# Altium integrated library Dip_Switches_rev15a.intlib: 131 symbols (part 1 of 2)
Pins are listed as number, name and electrical type; pins without a type are passive.

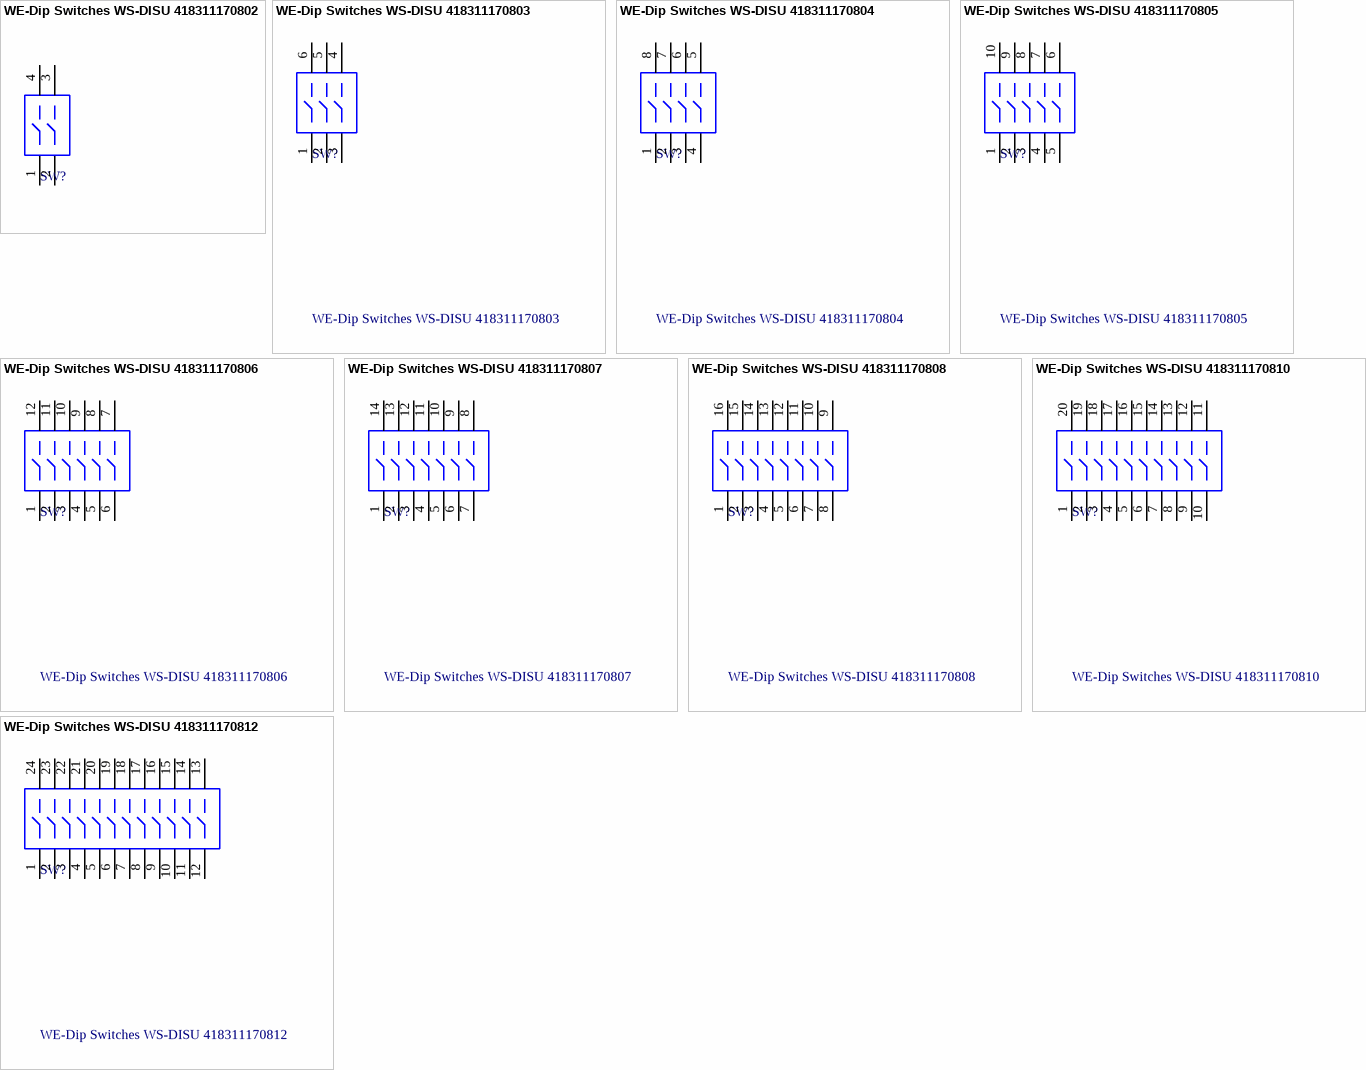
[diagram p0: symbols WE-Dip Switches WS-DISU 418311170802 to WE-Dip Switches WS-DISU 418311170812]

## WE-Dip Switches WS-DISU 418311170802
designator SW?
WS-DISU 2.54 mm piano type compact SMD Dip Switch with flat actuator; Manufacturer: Würth Elektronik eiSos GmbH & Co.KG; ComponentLink1 Description: Manufacturer; ComponentLink2 Description: Datasheet; Creat by: Karrer Zheng; NoPins: 4; Creat Date: 19 February 2014; partNo: 418311170802; ComponentLink1URL: http://www.we-online.com; ComponentLink2URL: http://katalog.we-online.de/em/datasheet/4183111708xx.pdf
footprint 418311170802 (02p, 2.54mm Pitch, Piano, Box Type SMT, flat Actuator, black, without Tape, T&R)
pins: 1, 2, 3, 4

## WE-Dip Switches WS-DISU 418311170803
designator SW?
WS-DISU 2.54 mm piano type compact SMD Dip Switch with flat actuator; Manufacturer: Würth Elektronik eiSos GmbH & Co.KG; ComponentLink1 Description: Manufacturer; ComponentLink2 Description: Datasheet; Creat by: Karrer Zheng; NoPins: 6; Creat Date: 19 February 2014; partNo: 418311170803; ComponentLink1URL: http://www.we-online.com; ComponentLink2URL: http://katalog.we-online.de/em/datasheet/4183111708xx.pdf
footprint 418311170803 (03p, 2.54mm Pitch, Piano, Box Type SMT, flat Actuator, black, without Tape, T&R)
pins: 1, 2, 3, 4, 5, 6

## WE-Dip Switches WS-DISU 418311170804
designator SW?
WS-DISU 2.54 mm piano type compact SMD Dip Switch with flat actuator; Manufacturer: Würth Elektronik eiSos GmbH & Co.KG; ComponentLink1 Description: Manufacturer; ComponentLink2 Description: Datasheet; Creat by: Karrer Zheng; NoPins: 8; Creat Date: 19 February 2014; partNo: 418311170804; ComponentLink1URL: http://www.we-online.com; ComponentLink2URL: http://katalog.we-online.de/em/datasheet/4183111708xx.pdf
footprint 418311170804 (04p, 2.54mm Pitch, Piano, Box Type SMT, flat Actuator, black, without Tape, T&R)
pins: 1, 2, 3, 4, 5, 6, 7, 8

## WE-Dip Switches WS-DISU 418311170805
designator SW?
WS-DISU 2.54 mm piano type compact SMD Dip Switch with flat actuator; Manufacturer: Würth Elektronik eiSos GmbH & Co.KG; ComponentLink1 Description: Manufacturer; ComponentLink2 Description: Datasheet; Creat by: Karrer Zheng; NoPins: 10; Creat Date: 19 February 2014; partNo: 418311170805; ComponentLink1URL: http://www.we-online.com; ComponentLink2URL: http://katalog.we-online.de/em/datasheet/4183111708xx.pdf
footprint 418311170805 (05p, 2.54mm Pitch, Piano, Box Type SMT, flat Actuator, black, without Tape, T&R)
pins: 1, 2, 3, 4, 5, 6, 7, 8, 9, 10

## WE-Dip Switches WS-DISU 418311170806
designator SW?
WS-DISU 2.54 mm piano type compact SMD Dip Switch with flat actuator; Manufacturer: Würth Elektronik eiSos GmbH & Co.KG; ComponentLink1 Description: Manufacturer; ComponentLink2 Description: Datasheet; Creat by: Karrer Zheng; NoPins: 12; Creat Date: 19 February 2014; partNo: 418311170806; ComponentLink1URL: http://www.we-online.com; ComponentLink2URL: http://katalog.we-online.de/em/datasheet/4183111708xx.pdf
footprint 418311170806 (06p, 2.54mm Pitch, Piano, Box Type SMT, flat Actuator, black, without Tape, T&R)
pins: 1, 2, 3, 4, 5, 6, 7, 8, 9, 10, 11, 12

## WE-Dip Switches WS-DISU 418311170807
designator SW?
WS-DISU 2.54 mm piano type compact SMD Dip Switch with flat actuator; Manufacturer: Würth Elektronik eiSos GmbH & Co.KG; ComponentLink1 Description: Manufacturer; ComponentLink2 Description: Datasheet; Creat by: Karrer Zheng; NoPins: 14; Creat Date: 19 February 2014; partNo: 418311170807; ComponentLink1URL: http://www.we-online.com; ComponentLink2URL: http://katalog.we-online.de/em/datasheet/4183111708xx.pdf
footprint 418311170807 (07p, 2.54mm Pitch, Piano, Box Type SMT, flat Actuator, black, without Tape, T&R)
pins: 1, 2, 3, 4, 5, 6, 7, 8, 9, 10, 11, 12, 13, 14

## WE-Dip Switches WS-DISU 418311170808
designator SW?
WS-DISU 2.54 mm piano type compact SMD Dip Switch with flat actuator; Manufacturer: Würth Elektronik eiSos GmbH & Co.KG; ComponentLink1 Description: Manufacturer; ComponentLink2 Description: Datasheet; Creat by: Karrer Zheng; NoPins: 16; Creat Date: 19 February 2014; partNo: 418311170808; ComponentLink1URL: http://www.we-online.com; ComponentLink2URL: http://katalog.we-online.de/em/datasheet/4183111708xx.pdf
footprint 418311170808 (08p, 2.54mm Pitch, Piano, Box Type SMT, flat Actuator, black, without Tape, T&R)
pins: 1, 2, 3, 4, 5, 6, 7, 8, 9, 10, 11, 12, 13, 14, 15, 16

## WE-Dip Switches WS-DISU 418311170810
designator SW?
WS-DISU 2.54 mm piano type compact SMD Dip Switch with flat actuator; Manufacturer: Würth Elektronik eiSos GmbH & Co.KG; ComponentLink1 Description: Manufacturer; ComponentLink2 Description: Datasheet; Creat by: Karrer Zheng; NoPins: 20; Creat Date: 19 February 2014; partNo: 418311170810; ComponentLink1URL: http://www.we-online.com; ComponentLink2URL: http://katalog.we-online.de/em/datasheet/4183111708xx.pdf
footprint 418311170810 (10p, 2.54mm Pitch, Piano, Box Type SMT, flat Actuator, black, without Tape, T&R)
pins: 1, 2, 3, 4, 5, 6, 7, 8, 9, 10, 11, 12, 13, 14, 15, 16, 17, 18, 19, 20

## WE-Dip Switches WS-DISU 418311170812
designator SW?
WS-DISU 2.54 mm piano type compact SMD Dip Switch with flat actuator; Manufacturer: Würth Elektronik eiSos GmbH & Co.KG; ComponentLink1 Description: Manufacturer; ComponentLink2 Description: Datasheet; Creat by: Karrer Zheng; NoPins: 24; Creat Date: 19 February 2014; partNo: 418311170812; ComponentLink1URL: http://www.we-online.com; ComponentLink2URL: http://katalog.we-online.de/em/datasheet/4183111708xx.pdf
footprint 418311170812 (12p, 2.54mm Pitch, Piano, Box Type SMT, flat Actuator, black, without Tape, T&R)
pins: 1, 2, 3, 4, 5, 6, 7, 8, 9, 10, 11, 12, 13, 14, 15, 16, 17, 18, 19, 20, 21, 22, 23, 24


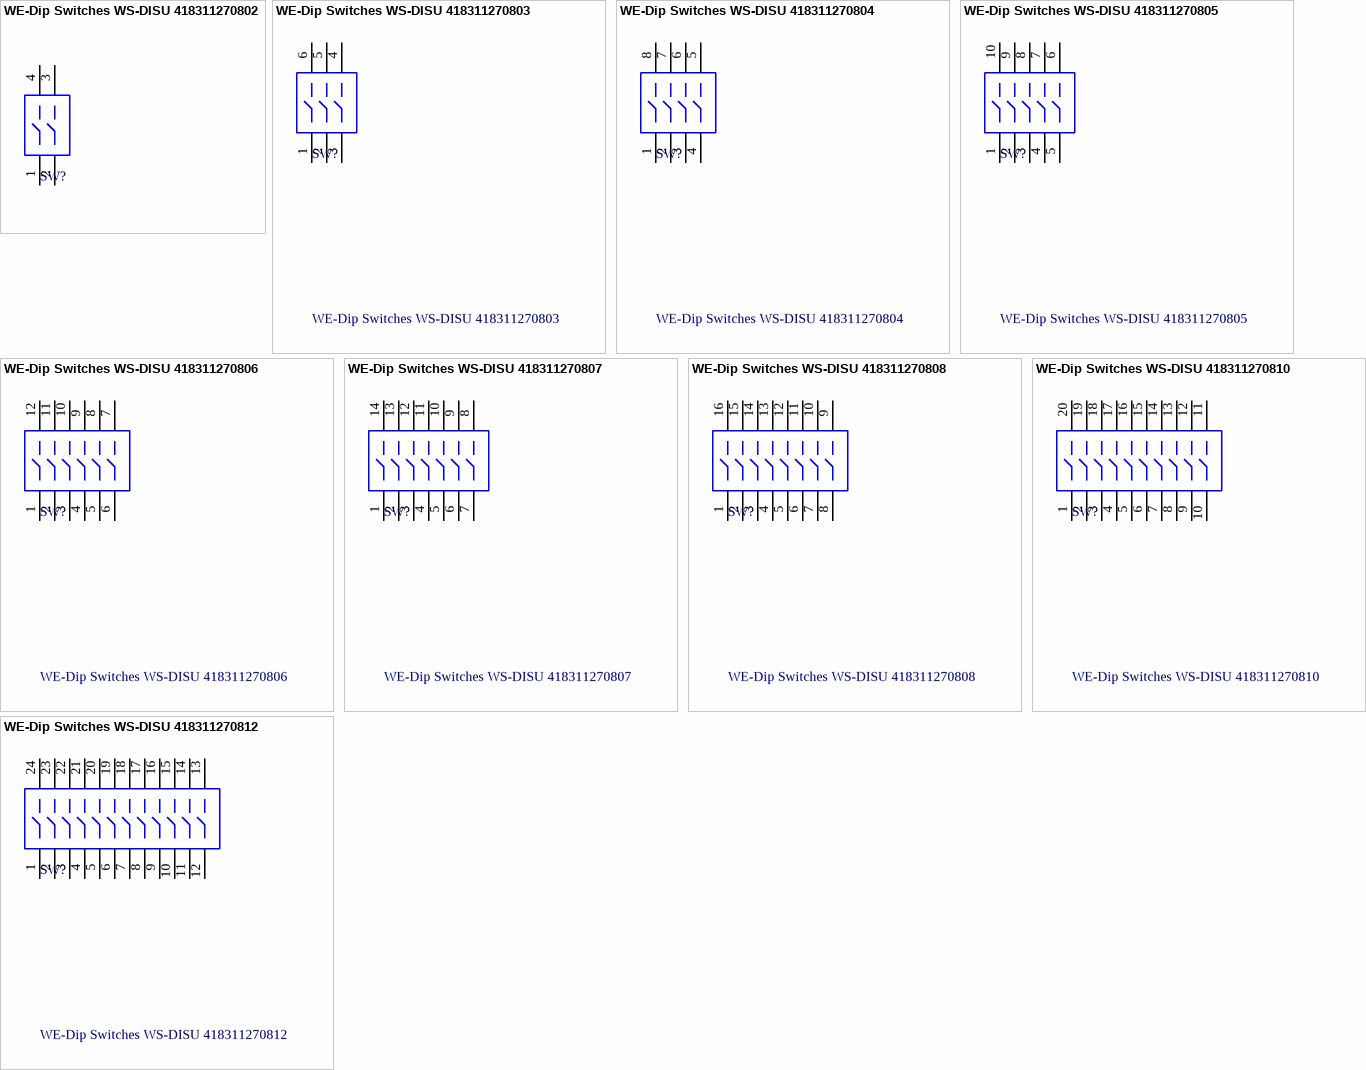
[diagram p1: symbols WE-Dip Switches WS-DISU 418311270802 to WE-Dip Switches WS-DISU 418311270812]

## WE-Dip Switches WS-DISU 418311270802
designator SW?
WS-DISU 2.54 mm piano type compact SMD Dip Switch with raised actuator; Manufacturer: Würth Elektronik eiSos GmbH & Co.KG; ComponentLink1 Description: Manufacturer; ComponentLink2 Description: Datasheet; Creat by: Karrer Zheng; NoPins: 04; Creat Date: 19 February 2014; partNo: 418311270802; ComponentLink1URL: http://www.we-online.com; ComponentLink2URL: http://katalog.we-online.de/em/datasheet/4183112708xx.pdf
footprint 418311270802 (02p, 2.54mm Pitch, Piano, Box Type SMT, raised Actuator, black, without Tape, T&R)
pins: 1, 2, 3, 4

## WE-Dip Switches WS-DISU 418311270803
designator SW?
WS-DISU 2.54 mm piano type compact SMD Dip Switch with raised actuator; Manufacturer: Würth Elektronik eiSos GmbH & Co.KG; ComponentLink1 Description: Manufacturer; ComponentLink2 Description: Datasheet; Creat by: Karrer Zheng; NoPins: 06; Creat Date: 19 February 2014; partNo: 418311270803; ComponentLink1URL: http://www.we-online.com; ComponentLink2URL: http://katalog.we-online.de/em/datasheet/4183112708xx.pdf
footprint 418311270803 (03p, 2.54mm Pitch, Piano, Box Type SMT, raised Actuator, black, without Tape, T&R)
pins: 1, 2, 3, 4, 5, 6

## WE-Dip Switches WS-DISU 418311270804
designator SW?
WS-DISU 2.54 mm piano type compact SMD Dip Switch with raised actuator; Manufacturer: Würth Elektronik eiSos GmbH & Co.KG; ComponentLink1 Description: Manufacturer; ComponentLink2 Description: Datasheet; Creat by: Karrer Zheng; NoPins: 8; Creat Date: 19 February 2014; partNo: 418311270804; ComponentLink1URL: http://www.we-online.com; ComponentLink2URL: http://katalog.we-online.de/em/datasheet/4183112708xx.pdf
footprint 418311270804 (04p, 2.54mm Pitch, Piano, Box Type SMT, raised Actuator, black, without Tape, T&R)
pins: 1, 2, 3, 4, 5, 6, 7, 8

## WE-Dip Switches WS-DISU 418311270805
designator SW?
WS-DISU 2.54 mm piano type compact SMD Dip Switch with raised actuator; Manufacturer: Würth Elektronik eiSos GmbH & Co.KG; ComponentLink1 Description: Manufacturer; ComponentLink2 Description: Datasheet; Creat by: Karrer Zheng; NoPins: 10; Creat Date: 19 February 2014; partNo: 418311270805; ComponentLink1URL: http://www.we-online.com; ComponentLink2URL: http://katalog.we-online.de/em/datasheet/4183112708xx.pdf
footprint 418311270805 (05p, 2.54mm Pitch, Piano, Box Type SMT, raised Actuator, black, without Tape, T&R)
pins: 1, 2, 3, 4, 5, 6, 7, 8, 9, 10

## WE-Dip Switches WS-DISU 418311270806
designator SW?
WS-DISU 2.54 mm piano type compact SMD Dip Switch with raised actuator; Manufacturer: Würth Elektronik eiSos GmbH & Co.KG; ComponentLink1 Description: Manufacturer; ComponentLink2 Description: Datasheet; Creat by: Karrer Zheng; NoPins: 12; Creat Date: 19 February 2014; partNo: 418311270806; ComponentLink1URL: http://www.we-online.com; ComponentLink2URL: http://katalog.we-online.de/em/datasheet/4183112708xx.pdf
footprint 418311270806 (06p, 2.54mm Pitch, Piano, Box Type SMT, raised Actuator, black, without Tape, T&R)
pins: 1, 2, 3, 4, 5, 6, 7, 8, 9, 10, 11, 12

## WE-Dip Switches WS-DISU 418311270807
designator SW?
WS-DISU 2.54 mm piano type compact SMD Dip Switch with raised actuator; Manufacturer: Würth Elektronik eiSos GmbH & Co.KG; ComponentLink1 Description: Manufacturer; ComponentLink2 Description: Datasheet; Creat by: Karrer Zheng; NoPins: 14; Creat Date: 19 February 2014; partNo: 418311270807; ComponentLink1URL: http://www.we-online.com; ComponentLink2URL: http://katalog.we-online.de/em/datasheet/4183112708xx.pdf
footprint 418311270807 (07p, 2.54mm Pitch, Piano, Box Type SMT, raised Actuator, black, without Tape, T&R)
pins: 1, 2, 3, 4, 5, 6, 7, 8, 9, 10, 11, 12, 13, 14

## WE-Dip Switches WS-DISU 418311270808
designator SW?
WS-DISU 2.54 mm piano type compact SMD Dip Switch with raised actuator; Manufacturer: Würth Elektronik eiSos GmbH & Co.KG; ComponentLink1 Description: Manufacturer; ComponentLink2 Description: Datasheet; Creat by: Karrer Zheng; NoPins: 16; Creat Date: 19 February 2014; partNo: 418311270808; ComponentLink1URL: http://www.we-online.com; ComponentLink2URL: http://katalog.we-online.de/em/datasheet/4183112708xx.pdf
footprint 418311270808 (08p, 2.54mm Pitch, Piano, Box Type SMT, raised Actuator, black, without Tape, T&R)
pins: 1, 2, 3, 4, 5, 6, 7, 8, 9, 10, 11, 12, 13, 14, 15, 16

## WE-Dip Switches WS-DISU 418311270810
designator SW?
WS-DISU 2.54 mm piano type compact SMD Dip Switch with raised actuator; Manufacturer: Würth Elektronik eiSos GmbH & Co.KG; ComponentLink1 Description: Manufacturer; ComponentLink2 Description: Datasheet; Creat by: Karrer Zheng; NoPins: 20; Creat Date: 19 February 2014; partNo: 418311270810; ComponentLink1URL: http://www.we-online.com; ComponentLink2URL: http://katalog.we-online.de/em/datasheet/4183112708xx.pdf
footprint 418311270810 (10p, 2.54mm Pitch, Piano, Box Type SMT, raised Actuator, black, without Tape, T&R)
pins: 1, 2, 3, 4, 5, 6, 7, 8, 9, 10, 11, 12, 13, 14, 15, 16, 17, 18, 19, 20

## WE-Dip Switches WS-DISU 418311270812
designator SW?
WS-DISU 2.54 mm piano type compact SMD Dip Switch with raised actuator; Manufacturer: Würth Elektronik eiSos GmbH & Co.KG; ComponentLink1 Description: Manufacturer; ComponentLink2 Description: Datasheet; Creat by: Karrer Zheng; NoPins: 24; Creat Date: 19 February 2014; partNo: 418311270812; ComponentLink1URL: http://www.we-online.com; ComponentLink2URL: http://katalog.we-online.de/em/datasheet/4183112708xx.pdf
footprint 418311270812 (12p, 2.54mm Pitch, Piano, Box Type SMT, raised Actuator, black, without Tape, T&R)
pins: 1, 2, 3, 4, 5, 6, 7, 8, 9, 10, 11, 12, 13, 14, 15, 16, 17, 18, 19, 20, 21, 22, 23, 24


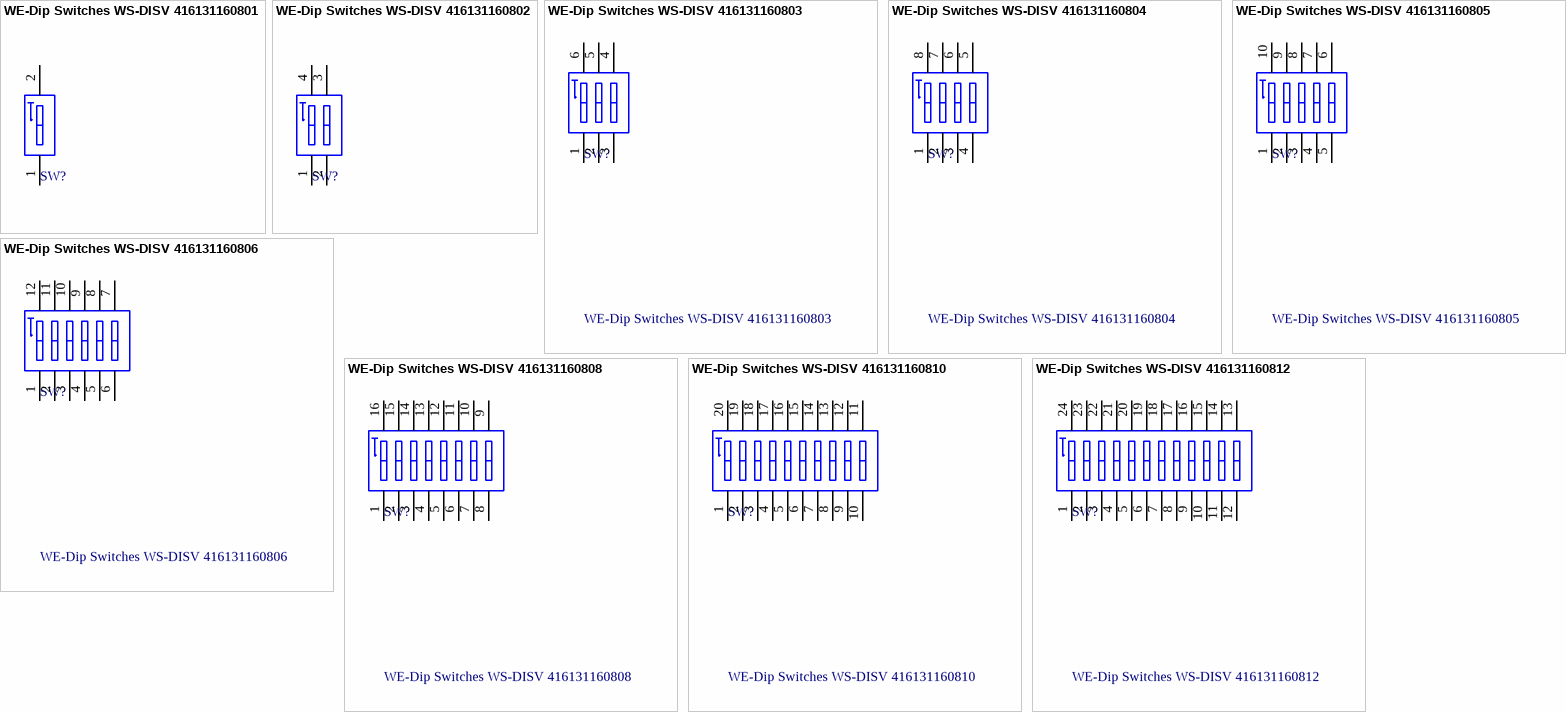
[diagram p2: symbols WE-Dip Switches WS-DISV 416131160801 to WE-Dip Switches WS-DISV 416131160812]

## WE-Dip Switches WS-DISV 416131160801
designator SW?
WS-DISV 1.27 mm small compact SMD Dip Switch with top tape; Manufacturer: Würth Elektronik eiSos GmbH & Co.KG; ComponentLink1 Description: Manufacturer; ComponentLink2 Description: Datasheet; Creat by: Karrer Zheng; NoPins: 02; Creat Date: 20 February 2014; partNo: 416131160801; ComponentLink1URL: http://www.we-online.com; ComponentLink2URL: http://katalog.we-online.de/em/datasheet/4161311608xx.pdf
footprint 416131160801 (01p, 1.27mm Pitch, Horizontal, HP Type, SMT, flat Actuator, black, with Tape, T&R)
pins: 1, 2

## WE-Dip Switches WS-DISV 416131160802
designator SW?
WS-DISV 1.27 mm small compact SMD Dip Switch with top tape; Manufacturer: Würth Elektronik eiSos GmbH & Co.KG; ComponentLink1 Description: Manufacturer; ComponentLink2 Description: Datasheet; Creat by: Karrer Zheng; NoPins: 04; Creat Date: 20 February 2014; partNo: 416131160802; ComponentLink1URL: http://www.we-online.com; ComponentLink2URL: http://katalog.we-online.de/em/datasheet/4161311608xx.pdf
footprint 416131160802 (02p, 1.27mm Pitch, Horizontal, HP Type, SMT, flat Actuator, black, with Tape, T&R)
pins: 1, 2, 3, 4

## WE-Dip Switches WS-DISV 416131160803
designator SW?
WS-DISV 1.27 mm small compact SMD Dip Switch with top tape; Manufacturer: Würth Elektronik eiSos GmbH & Co.KG; ComponentLink1 Description: Manufacturer; ComponentLink2 Description: Datasheet; Creat by: Karrer Zheng; NoPins: 06; Creat Date: 20 February 2014; partNo: 416131160803; ComponentLink1URL: http://www.we-online.com; ComponentLink2URL: http://katalog.we-online.de/em/datasheet/4161311608xx.pdf
footprint 416131160803 (03p, 1.27mm Pitch, Horizontal, HP Type, SMT, flat Actuator, black, with Tape, T&R)
pins: 1, 2, 3, 4, 5, 6

## WE-Dip Switches WS-DISV 416131160804
designator SW?
WS-DISV 1.27 mm small compact SMD Dip Switch with top tape; Manufacturer: Würth Elektronik eiSos GmbH & Co.KG; ComponentLink1 Description: Manufacturer; ComponentLink2 Description: Datasheet; Creat by: Karrer Zheng; NoPins: 08; Creat Date: 20 February 2014; partNo: 416131160804; ComponentLink1URL: http://www.we-online.com; ComponentLink2URL: http://katalog.we-online.de/em/datasheet/4161311608xx.pdf
footprint 416131160804 (04p, 1.27mm Pitch, Horizontal, HP Type, SMT, flat Actuator, black, with Tape, T&R)
pins: 1, 2, 3, 4, 5, 6, 7, 8

## WE-Dip Switches WS-DISV 416131160805
designator SW?
WS-DISV 1.27 mm small compact SMD Dip Switch with top tape; Manufacturer: Würth Elektronik eiSos GmbH & Co.KG; ComponentLink1 Description: Manufacturer; ComponentLink2 Description: Datasheet; Creat by: Karrer Zheng; NoPins: 10; Creat Date: 20 February 2014; partNo: 416131160805; ComponentLink1URL: http://www.we-online.com; ComponentLink2URL: http://katalog.we-online.de/em/datasheet/4161311608xx.pdf
footprint 416131160805 (05p, 1.27mm Pitch, Horizontal, HP Type, SMT, flat Actuator, black, with Tape, T&R)
pins: 1, 2, 3, 4, 5, 6, 7, 8, 9, 10

## WE-Dip Switches WS-DISV 416131160806
designator SW?
WS-DISV 1.27 mm small compact SMD Dip Switch with top tape; Manufacturer: Würth Elektronik eiSos GmbH & Co.KG; ComponentLink1 Description: Manufacturer; ComponentLink2 Description: Datasheet; Creat by: Karrer Zheng; NoPins: 12; Creat Date: 20 February 2014; partNo: 416131160806; ComponentLink1URL: http://www.we-online.com; ComponentLink2URL: http://katalog.we-online.de/em/datasheet/4161311608xx.pdf
footprint 416131160806 (06p, 1.27mm Pitch, Horizontal, HP Type, SMT, flat Actuator, black, with Tape, T&R)
pins: 1, 2, 3, 4, 5, 6, 7, 8, 9, 10, 11, 12

## WE-Dip Switches WS-DISV 416131160808
designator SW?
WS-DISV 1.27 mm small compact SMD Dip Switch with top tape; Manufacturer: Würth Elektronik eiSos GmbH & Co.KG; ComponentLink1 Description: Manufacturer; ComponentLink2 Description: Datasheet; Creat by: Karrer Zheng; NoPins: 16; Creat Date: 20 February 2014; partNo: 416131160808; ComponentLink1URL: http://www.we-online.com; ComponentLink2URL: http://katalog.we-online.de/em/datasheet/4161311608xx.pdf
footprint 416131160808 (08p, 1.27mm Pitch, Horizontal, HP Type, SMT, flat Actuator, black, with Tape, T&R)
pins: 1, 2, 3, 4, 5, 6, 7, 8, 9, 10, 11, 12, 13, 14, 15, 16

## WE-Dip Switches WS-DISV 416131160810
designator SW?
WS-DISV 1.27 mm small compact SMD Dip Switch with top tape; Manufacturer: Würth Elektronik eiSos GmbH & Co.KG; ComponentLink1 Description: Manufacturer; ComponentLink2 Description: Datasheet; Creat by: Karrer Zheng; NoPins: 20; Creat Date: 20 February 2014; partNo: 416131160810; ComponentLink1URL: http://www.we-online.com; ComponentLink2URL: http://katalog.we-online.de/em/datasheet/4161311608xx.pdf
footprint 416131160810 (10p, 1.27mm Pitch, Horizontal, HP Type, SMT, flat Actuator, black, with Tape, T&R)
pins: 1, 2, 3, 4, 5, 6, 7, 8, 9, 10, 11, 12, 13, 14, 15, 16, 17, 18, 19, 20

## WE-Dip Switches WS-DISV 416131160812
designator SW?
WS-DISV 1.27 mm small compact SMD Dip Switch with top tape; Manufacturer: Würth Elektronik eiSos GmbH & Co.KG; ComponentLink1 Description: Manufacturer; ComponentLink2 Description: Datasheet; Creat by: Karrer Zheng; NoPins: 24; Creat Date: 20 February 2014; partNo: 416131160812; ComponentLink1URL: http://www.we-online.com; ComponentLink2URL: http://katalog.we-online.de/em/datasheet/4161311608xx.pdf
footprint 416131160812 (12p, 1.27mm Pitch, Horizontal, HP Type, SMT, flat Actuator, black, with Tape, T&R)
pins: 1, 2, 3, 4, 5, 6, 7, 8, 9, 10, 11, 12, 13, 14, 15, 16, 17, 18, 19, 20, 21, 22, 23, 24


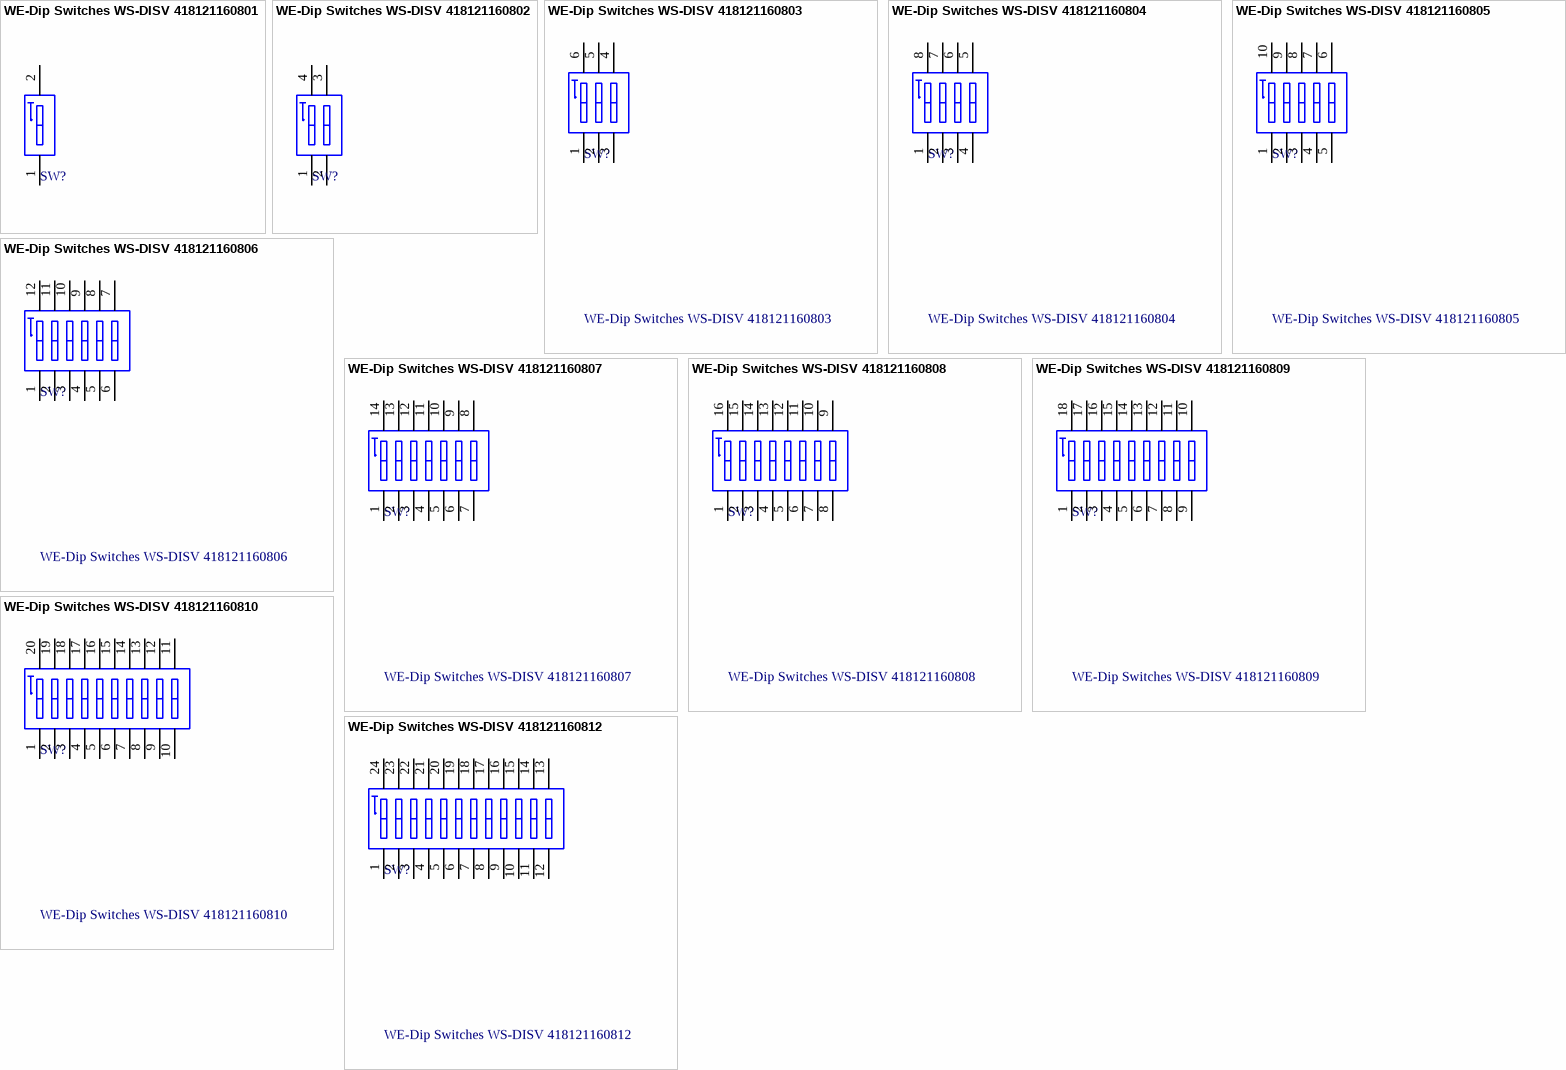
[diagram p3: symbols WE-Dip Switches WS-DISV 418121160801 to WE-Dip Switches WS-DISV 418121160812]

## WE-Dip Switches WS-DISV 418121160801
designator SW?
WS-DISV 2.54 mm small compact SMD Dip Switch with top tape; Manufacturer: Würth Elektronik eiSos GmbH & Co.KG; ComponentLink1 Description: Manufacturer; ComponentLink2 Description: Datasheet; Creat by: Karrer Zheng; NoPins: 02; Creat Date: 20 February 2014; partNo: 418121160801; ComponentLink1URL: http://www.we-online.com; ComponentLink2URL: http://katalog.we-online.de/em/datasheet/4181211608xx.pdf
footprint 418121160801 (01p, 2.54mm Pitch, Horizontal, IC Type, SMT, flat Actuator, black, with Tape, T&R)
pins: 1, 2

## WE-Dip Switches WS-DISV 418121160802
designator SW?
WS-DISV 2.54 mm small compact SMD Dip Switch with top tape; Manufacturer: Würth Elektronik eiSos GmbH & Co.KG; ComponentLink1 Description: Manufacturer; ComponentLink2 Description: Datasheet; Creat by: Karrer Zheng; NoPins: 04; Creat Date: 20 February 2014; partNo: 418121160802; ComponentLink1URL: http://www.we-online.com; ComponentLink2URL: http://katalog.we-online.de/em/datasheet/4181211608xx.pdf
footprint 418121160802 (02p, 2.54mm Pitch, Horizontal, IC Type, SMT, flat Actuator, black, with Tape, T&R)
pins: 1, 2, 3, 4

## WE-Dip Switches WS-DISV 418121160803
designator SW?
WS-DISV 2.54 mm small compact SMD Dip Switch with top tape; Manufacturer: Würth Elektronik eiSos GmbH & Co.KG; ComponentLink1 Description: Manufacturer; ComponentLink2 Description: Datasheet; Creat by: Karrer Zheng; NoPins: 06; Creat Date: 20 February 2014; partNo: 418121160803; ComponentLink1URL: http://www.we-online.com; ComponentLink2URL: http://katalog.we-online.de/em/datasheet/4181211608xx.pdf
footprint 418121160803 (03p, 2.54mm Pitch, Horizontal, IC Type, SMT, flat Actuator, black, with Tape, T&R)
pins: 1, 2, 3, 4, 5, 6

## WE-Dip Switches WS-DISV 418121160804
designator SW?
WS-DISV 2.54 mm small compact SMD Dip Switch with top tape; Manufacturer: Würth Elektronik eiSos GmbH & Co.KG; ComponentLink1 Description: Manufacturer; ComponentLink2 Description: Datasheet; Creat by: Karrer Zheng; NoPins: 08; Creat Date: 20 February 2014; partNo: 418121160804; ComponentLink1URL: http://www.we-online.com; ComponentLink2URL: http://katalog.we-online.de/em/datasheet/4181211608xx.pdf
footprint 418121160804 (04p, 2.54mm Pitch, Horizontal, IC Type, SMT, flat Actuator, black, with Tape, T&R)
pins: 1, 2, 3, 4, 5, 6, 7, 8

## WE-Dip Switches WS-DISV 418121160805
designator SW?
WS-DISV 2.54 mm small compact SMD Dip Switch with top tape; Manufacturer: Würth Elektronik eiSos GmbH & Co.KG; ComponentLink1 Description: Manufacturer; ComponentLink2 Description: Datasheet; Creat by: Karrer Zheng; NoPins: 10; Creat Date: 20 February 2014; partNo: 418121160805; ComponentLink1URL: http://www.we-online.com; ComponentLink2URL: http://katalog.we-online.de/em/datasheet/4181211608xx.pdf
footprint 418121160805 (05p, 2.54mm Pitch, Horizontal, IC Type, SMT, flat Actuator, black, with Tape, T&R)
pins: 1, 2, 3, 4, 5, 6, 7, 8, 9, 10

## WE-Dip Switches WS-DISV 418121160806
designator SW?
WS-DISV 2.54 mm small compact SMD Dip Switch with top tape; Manufacturer: Würth Elektronik eiSos GmbH & Co.KG; ComponentLink1 Description: Manufacturer; ComponentLink2 Description: Datasheet; Creat by: Karrer Zheng; NoPins: 12; Creat Date: 20 February 2014; partNo: 418121160806; ComponentLink1URL: http://www.we-online.com; ComponentLink2URL: http://katalog.we-online.de/em/datasheet/4181211608xx.pdf
footprint 418121160806 (06p, 2.54mm Pitch, Horizontal, IC Type, SMT, flat Actuator, black, with Tape, T&R)
pins: 1, 2, 3, 4, 5, 6, 7, 8, 9, 10, 11, 12

## WE-Dip Switches WS-DISV 418121160807
designator SW?
WS-DISV 2.54 mm small compact SMD Dip Switch with top tape; Manufacturer: Würth Elektronik eiSos GmbH & Co.KG; ComponentLink1 Description: Manufacturer; ComponentLink2 Description: Datasheet; Creat by: Karrer Zheng; NoPins: 14; Creat Date: 20 February 2014; partNo: 418121160807; ComponentLink1URL: http://www.we-online.com; ComponentLink2URL: http://katalog.we-online.de/em/datasheet/4181211608xx.pdf
footprint 418121160807 (07p, 2.54mm Pitch, Horizontal, IC Type, SMT, flat Actuator, black, with Tape, T&R)
pins: 1, 2, 3, 4, 5, 6, 7, 8, 9, 10, 11, 12, 13, 14

## WE-Dip Switches WS-DISV 418121160808
designator SW?
WS-DISV 2.54 mm small compact SMD Dip Switch with top tape; Manufacturer: Würth Elektronik eiSos GmbH & Co.KG; ComponentLink1 Description: Manufacturer; ComponentLink2 Description: Datasheet; Creat by: Karrer Zheng; NoPins: 16; Creat Date: 20 February 2014; partNo: 418121160808; ComponentLink1URL: http://www.we-online.com; ComponentLink2URL: http://katalog.we-online.de/em/datasheet/4181211608xx.pdf
footprint 418121160808 (08p, 2.54mm Pitch, Horizontal, IC Type, SMT, flat Actuator, black, with Tape, T&R)
pins: 1, 2, 3, 4, 5, 6, 7, 8, 9, 10, 11, 12, 13, 14, 15, 16

## WE-Dip Switches WS-DISV 418121160809
designator SW?
WS-DISV 2.54 mm small compact SMD Dip Switch with top tape; Manufacturer: Würth Elektronik eiSos GmbH & Co.KG; ComponentLink1 Description: Manufacturer; ComponentLink2 Description: Datasheet; Creat by: Karrer Zheng; NoPins: 18; Creat Date: 20 February 2014; partNo: 418121160809; ComponentLink1URL: http://www.we-online.com; ComponentLink2URL: http://katalog.we-online.de/em/datasheet/4181211608xx.pdf
footprint 418121160809 (09p, 2.54mm Pitch, Horizontal, IC Type, SMT, flat Actuator, black, with Tape, T&R)
pins: 1, 2, 3, 4, 5, 6, 7, 8, 9, 10, 11, 12, 13, 14, 15, 16, 17, 18

## WE-Dip Switches WS-DISV 418121160810
designator SW?
WS-DISV 2.54 mm small compact SMD Dip Switch with top tape; Manufacturer: Würth Elektronik eiSos GmbH & Co.KG; ComponentLink1 Description: Manufacturer; ComponentLink2 Description: Datasheet; Creat by: Karrer Zheng; NoPins: 12; Creat Date: 20 February 2014; partNo: 418121160810; ComponentLink1URL: http://www.we-online.com; ComponentLink2URL: http://katalog.we-online.de/em/datasheet/4181211608xx.pdf
footprint 418121160810 (10p, 2.54mm Pitch, Horizontal, IC Type, SMT, flat Actuator, black, with Tape, T&R)
pins: 1, 2, 3, 4, 5, 6, 7, 8, 9, 10, 11, 12, 13, 14, 15, 16, 17, 18, 19, 20

## WE-Dip Switches WS-DISV 418121160812
designator SW?
WS-DISV 2.54 mm small compact SMD Dip Switch with top tape; Manufacturer: Würth Elektronik eiSos GmbH & Co.KG; ComponentLink1 Description: Manufacturer; ComponentLink2 Description: Datasheet; Creat by: Karrer Zheng; NoPins: 24; Creat Date: 20 February 2014; partNo: 418121160812; ComponentLink1URL: http://www.we-online.com; ComponentLink2URL: http://katalog.we-online.de/em/datasheet/4181211608xx.pdf
footprint 418121160812 (12p, 2.54mm Pitch, Horizontal, IC Type, SMT, flat Actuator, black, with Tape, T&R)
pins: 1, 2, 3, 4, 5, 6, 7, 8, 9, 10, 11, 12, 13, 14, 15, 16, 17, 18, 19, 20, 21, 22, 23, 24


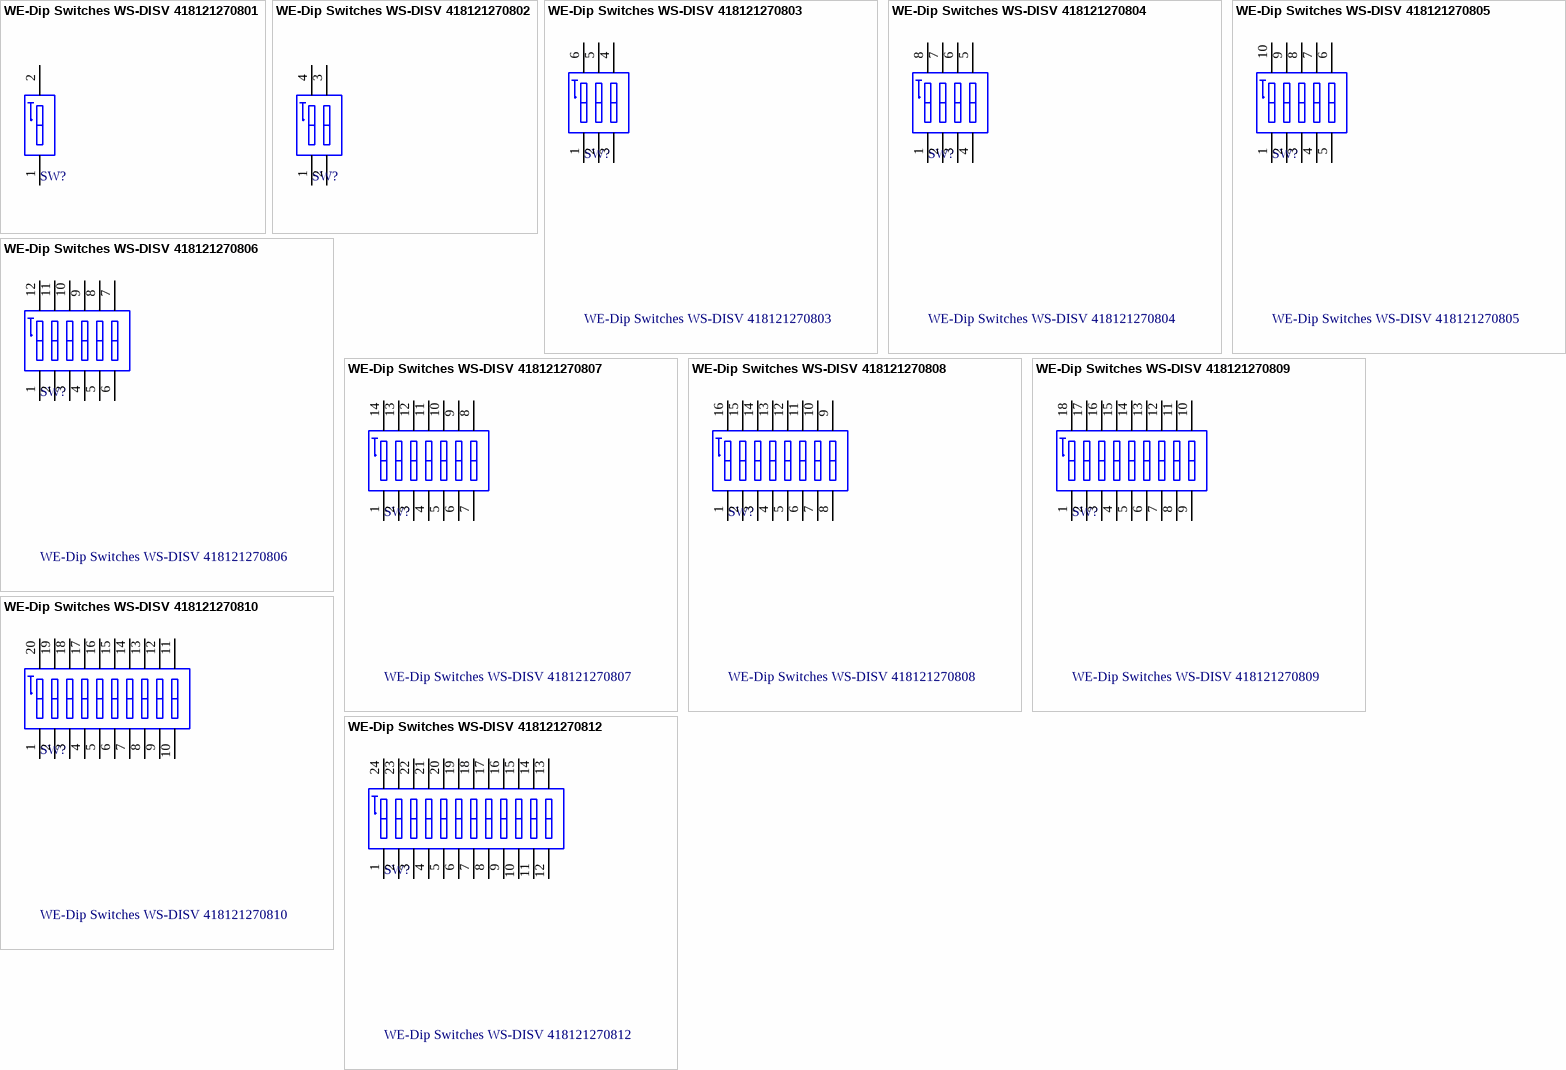
[diagram p4: symbols WE-Dip Switches WS-DISV 418121270801 to WE-Dip Switches WS-DISV 418121270812]

## WE-Dip Switches WS-DISV 418121270801
designator SW?
WS-DISV 2.54 mm small compact SMD Dip Switch with raised actuator; Manufacturer: Würth Elektronik eiSos GmbH & Co.KG; ComponentLink1 Description: Manufacturer; ComponentLink2 Description: Datasheet; Creat by: Karrer Zheng; NoPins: 02; Creat Date: 20 February 2014; partNo: 418121270801; ComponentLink1URL: http://www.we-online.com; ComponentLink2URL: http://katalog.we-online.de/em/datasheet/4181212708xx.pdf
footprint 418121270801 (01p, 2.54mm Pitch, Horizontal, IC Type, SMT, raised Actuator, black, without Tape, T&R)
pins: 1, 2

## WE-Dip Switches WS-DISV 418121270802
designator SW?
WS-DISV 2.54 mm small compact SMD Dip Switch with raised actuator; Manufacturer: Würth Elektronik eiSos GmbH & Co.KG; ComponentLink1 Description: Manufacturer; ComponentLink2 Description: Datasheet; Creat by: Karrer Zheng; NoPins: 04; Creat Date: 20 February 2014; partNo: 418121270802; ComponentLink1URL: http://www.we-online.com; ComponentLink2URL: http://katalog.we-online.de/em/datasheet/4181212708xx.pdf
footprint 418121270802 (02p, 2.54mm Pitch, Horizontal, IC Type, SMT, raised Actuator, black, without Tape, T&R)
pins: 1, 2, 3, 4

## WE-Dip Switches WS-DISV 418121270803
designator SW?
WS-DISV 2.54 mm small compact SMD Dip Switch with raised actuator; Manufacturer: Würth Elektronik eiSos GmbH & Co.KG; ComponentLink1 Description: Manufacturer; ComponentLink2 Description: Datasheet; Creat by: Karrer Zheng; NoPins: 06; Creat Date: 20 February 2014; partNo: 418121270803; ComponentLink1URL: http://www.we-online.com; ComponentLink2URL: http://katalog.we-online.de/em/datasheet/4181212708xx.pdf
footprint 418121270803 (03p, 2.54mm Pitch, Horizontal, IC Type, SMT, raised Actuator, black, without Tape, T&R)
pins: 1, 2, 3, 4, 5, 6

## WE-Dip Switches WS-DISV 418121270804
designator SW?
WS-DISV 2.54 mm small compact SMD Dip Switch with raised actuator; Manufacturer: Würth Elektronik eiSos GmbH & Co.KG; ComponentLink1 Description: Manufacturer; ComponentLink2 Description: Datasheet; Creat by: Karrer Zheng; NoPins: 08; Creat Date: 20 February 2014; partNo: 418121270804; ComponentLink1URL: http://www.we-online.com; ComponentLink2URL: http://katalog.we-online.de/em/datasheet/4181212708xx.pdf
footprint 418121270804 (04p, 2.54mm Pitch, Horizontal, IC Type, SMT, raised Actuator, black, without Tape, T&R)
pins: 1, 2, 3, 4, 5, 6, 7, 8

## WE-Dip Switches WS-DISV 418121270805
designator SW?
WS-DISV 2.54 mm small compact SMD Dip Switch with raised actuator; Manufacturer: Würth Elektronik eiSos GmbH & Co.KG; ComponentLink1 Description: Manufacturer; ComponentLink2 Description: Datasheet; Creat by: Karrer Zheng; NoPins: 10; Creat Date: 20 February 2014; partNo: 418121270805; ComponentLink1URL: http://www.we-online.com; ComponentLink2URL: http://katalog.we-online.de/em/datasheet/4181212708xx.pdf
footprint 418121270805 (05p, 2.54mm Pitch, Horizontal, IC Type, SMT, raised Actuator, black, without Tape, T&R)
pins: 1, 2, 3, 4, 5, 6, 7, 8, 9, 10

## WE-Dip Switches WS-DISV 418121270806
designator SW?
WS-DISV 2.54 mm small compact SMD Dip Switch with raised actuator; Manufacturer: Würth Elektronik eiSos GmbH & Co.KG; ComponentLink1 Description: Manufacturer; ComponentLink2 Description: Datasheet; Creat by: Karrer Zheng; NoPins: 12; Creat Date: 20 February 2014; partNo: 418121270806; ComponentLink1URL: http://www.we-online.com; ComponentLink2URL: http://katalog.we-online.de/em/datasheet/4181212708xx.pdf
footprint 418121270806 (06p, 2.54mm Pitch, Horizontal, IC Type, SMT, raised Actuator, black, without Tape, T&R)
pins: 1, 2, 3, 4, 5, 6, 7, 8, 9, 10, 11, 12

## WE-Dip Switches WS-DISV 418121270807
designator SW?
WS-DISV 2.54 mm small compact SMD Dip Switch with raised actuator; Manufacturer: Würth Elektronik eiSos GmbH & Co.KG; ComponentLink1 Description: Manufacturer; ComponentLink2 Description: Datasheet; Creat by: Karrer Zheng; NoPins: 14; Creat Date: 20 February 2014; partNo: 418121270807; ComponentLink1URL: http://www.we-online.com; ComponentLink2URL: http://katalog.we-online.de/em/datasheet/4181212708xx.pdf
footprint 418121270807 (07p, 2.54mm Pitch, Horizontal, IC Type, SMT, raised Actuator, black, without Tape, T&R)
pins: 1, 2, 3, 4, 5, 6, 7, 8, 9, 10, 11, 12, 13, 14

## WE-Dip Switches WS-DISV 418121270808
designator SW?
WS-DISV 2.54 mm small compact SMD Dip Switch with raised actuator; Manufacturer: Würth Elektronik eiSos GmbH & Co.KG; ComponentLink1 Description: Manufacturer; ComponentLink2 Description: Datasheet; Creat by: Karrer Zheng; NoPins: 16; Creat Date: 20 February 2014; partNo: 418121270808; ComponentLink1URL: http://www.we-online.com; ComponentLink2URL: http://katalog.we-online.de/em/datasheet/4181212708xx.pdf
footprint 418121270808 (08p, 2.54mm Pitch, Horizontal, IC Type, SMT, raised Actuator, black, without Tape, T&R)
pins: 1, 2, 3, 4, 5, 6, 7, 8, 9, 10, 11, 12, 13, 14, 15, 16

## WE-Dip Switches WS-DISV 418121270809
designator SW?
WS-DISV 2.54 mm small compact SMD Dip Switch with raised actuator; Manufacturer: Würth Elektronik eiSos GmbH & Co.KG; ComponentLink1 Description: Manufacturer; ComponentLink2 Description: Datasheet; Creat by: Karrer Zheng; NoPins: 18; Creat Date: 20 February 2014; partNo: 418121270809; ComponentLink1URL: http://www.we-online.com; ComponentLink2URL: http://katalog.we-online.de/em/datasheet/4181212708xx.pdf
footprint 418121270809 (09p, 2.54mm Pitch, Horizontal, IC Type, SMT, raised Actuator, black, without Tape, T&R)
pins: 1, 2, 3, 4, 5, 6, 7, 8, 9, 10, 11, 12, 13, 14, 15, 16, 17, 18

## WE-Dip Switches WS-DISV 418121270810
designator SW?
WS-DISV 2.54 mm small compact SMD Dip Switch with raised actuator; Manufacturer: Würth Elektronik eiSos GmbH & Co.KG; ComponentLink1 Description: Manufacturer; ComponentLink2 Description: Datasheet; Creat by: Karrer Zheng; NoPins: 20; Creat Date: 20 February 2014; partNo: 418121270810; ComponentLink1URL: http://www.we-online.com; ComponentLink2URL: http://katalog.we-online.de/em/datasheet/4181212708xx.pdf
footprint 418121270810 (10p, 2.54mm Pitch, Horizontal, IC Type, SMT, raised Actuator, black, without Tape, T&R)
pins: 1, 2, 3, 4, 5, 6, 7, 8, 9, 10, 11, 12, 13, 14, 15, 16, 17, 18, 19, 20

## WE-Dip Switches WS-DISV 418121270812
designator SW?
WS-DISV 2.54 mm small compact SMD Dip Switch with raised actuator; Manufacturer: Würth Elektronik eiSos GmbH & Co.KG; ComponentLink1 Description: Manufacturer; ComponentLink2 Description: Datasheet; Creat by: Karrer Zheng; NoPins: 24; Creat Date: 20 February 2014; partNo: 418121270812; ComponentLink1URL: http://www.we-online.com; ComponentLink2URL: http://katalog.we-online.de/em/datasheet/4181212708xx.pdf
footprint 418121270812 (12p, 2.54mm Pitch, Horizontal, IC Type, SMT, raised Actuator, black, without Tape, T&R)
pins: 1, 2, 3, 4, 5, 6, 7, 8, 9, 10, 11, 12, 13, 14, 15, 16, 17, 18, 19, 20, 21, 22, 23, 24


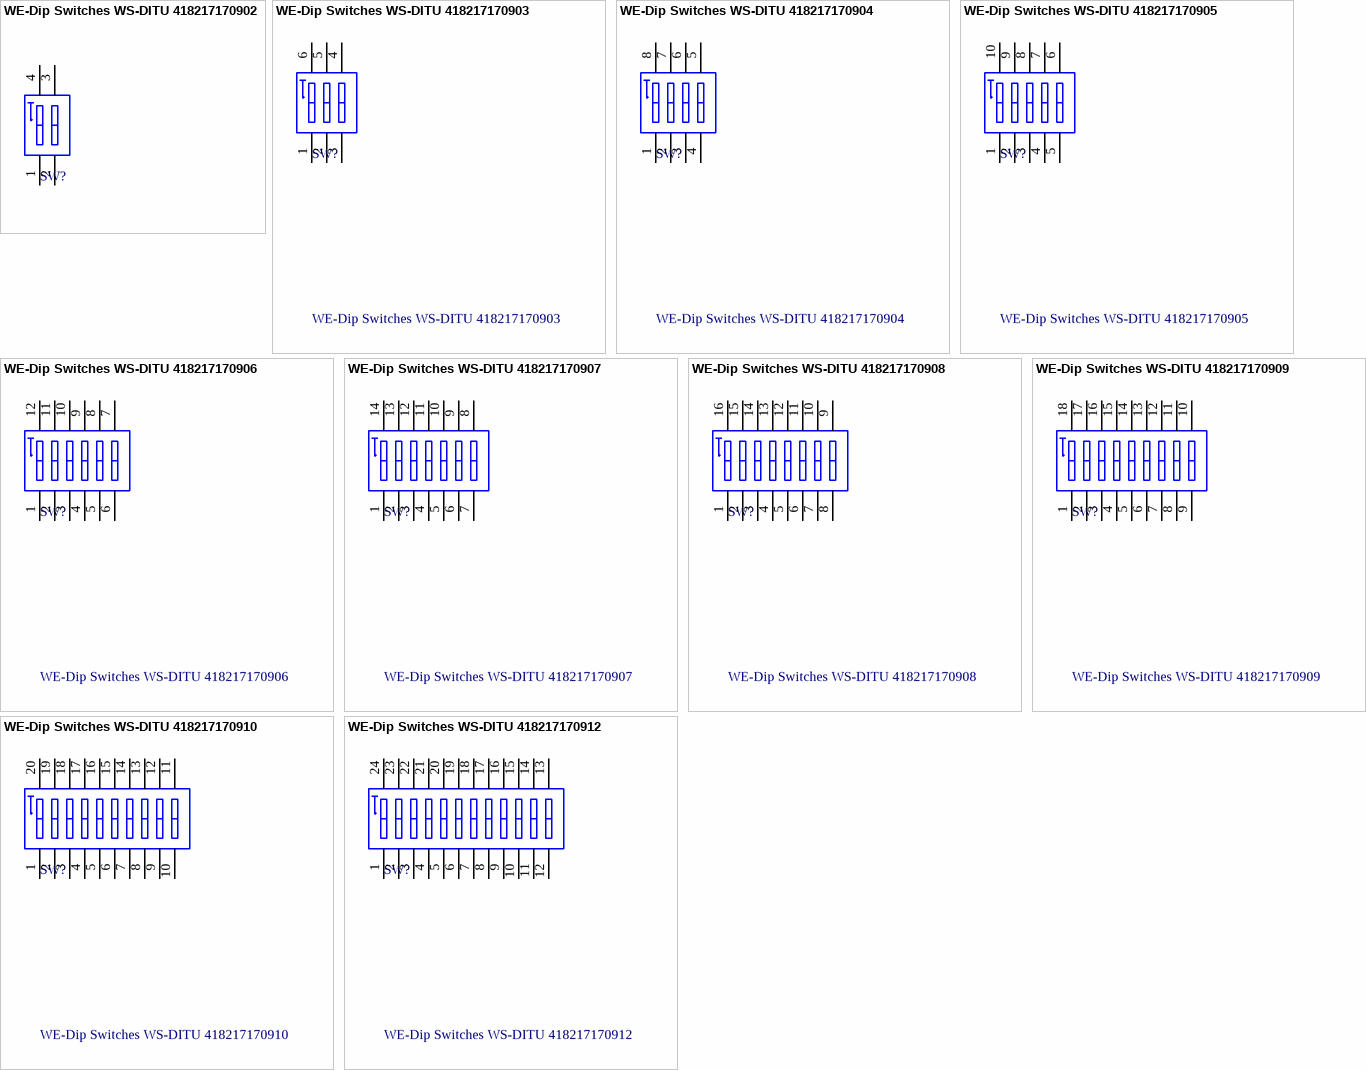
[diagram p5: symbols WE-Dip Switches WS-DITU 418217170902 to WE-Dip Switches WS-DITU 418217170912]

## WE-Dip Switches WS-DITU 418217170902
designator SW?
WS-DITU 2.54 mm right angled compact THT Dip Switch with flat actuator; Manufacturer: Würth Elektronik eiSos GmbH & Co.KG; ComponentLink1 Description: Manufacturer; ComponentLink2 Description: Datasheet; Creat by: Karrer Zheng; NoPins: 4; Creat Date: 13 February 2014; partNo: 418217170902; ComponentLink1URL: http://www.we-online.com; ComponentLink2URL: http://katalog.we-online.de/em/datasheet/4182171709xx.pdf
footprint 418217170902 (02p, 2.54mm Pitch, Right Angled, Box Type, THT, flat Actuator, red, without Tape, Tube)
pins: 1, 2, 3, 4

## WE-Dip Switches WS-DITU 418217170903
designator SW?
WS-DITU 2.54 mm right angled compact THT Dip Switch with flat actuator; Manufacturer: Würth Elektronik eiSos GmbH & Co.KG; ComponentLink1 Description: Manufacturer; ComponentLink2 Description: Datasheet; Creat by: Karrer Zheng; NoPins: 6; Creat Date: 13 February 2014; partNo: 418217170903; ComponentLink1URL: http://www.we-online.com; ComponentLink2URL: http://katalog.we-online.de/em/datasheet/4182171709xx.pdf
footprint 418217170903 (03p, 2.54mm Pitch, Right Angled, Box Type, THT, flat Actuator, red, without Tape, Tube)
pins: 1, 2, 3, 4, 5, 6

## WE-Dip Switches WS-DITU 418217170904
designator SW?
WS-DITU 2.54 mm right angled compact THT Dip Switch with flat actuator; Manufacturer: Würth Elektronik eiSos GmbH & Co.KG; ComponentLink1 Description: Manufacturer; ComponentLink2 Description: Datasheet; Creat by: Karrer Zheng; NoPins: 8; Creat Date: 13 February 2014; partNo: 418217170904; ComponentLink1URL: http://www.we-online.com; ComponentLink2URL: http://katalog.we-online.de/em/datasheet/4182171709xx.pdf
footprint 418217170904 (04p, 2.54mm Pitch, Right Angled, Box Type, THT, flat Actuator, red, without Tape, Tube)
pins: 1, 2, 3, 4, 5, 6, 7, 8

## WE-Dip Switches WS-DITU 418217170905
designator SW?
WS-DITU 2.54 mm right angled compact THT Dip Switch with flat actuator; Manufacturer: Würth Elektronik eiSos GmbH & Co.KG; ComponentLink1 Description: Manufacturer; ComponentLink2 Description: Datasheet; Creat by: Karrer Zheng; NoPins: 10; Creat Date: 13 February 2014; partNo: 418217170905; ComponentLink1URL: http://www.we-online.com; ComponentLink2URL: http://katalog.we-online.de/em/datasheet/4182171709xx.pdf
footprint 418217170905 (05p, 2.54mm Pitch, Right Angled, Box Type, THT, flat Actuator, red, without Tape, Tube)
pins: 1, 2, 3, 4, 5, 6, 7, 8, 9, 10

## WE-Dip Switches WS-DITU 418217170906
designator SW?
WS-DITU 2.54 mm right angled compact THT Dip Switch with flat actuator; Manufacturer: Würth Elektronik eiSos GmbH & Co.KG; ComponentLink1 Description: Manufacturer; ComponentLink2 Description: Datasheet; Creat by: Karrer Zheng; NoPins: 12; Creat Date: 13 February 2014; partNo: 418217170906; ComponentLink1URL: http://www.we-online.com; ComponentLink2URL: http://katalog.we-online.de/em/datasheet/4182171709xx.pdf
footprint 418217170906 (06p, 2.54mm Pitch, Right Angled, Box Type, THT,flat Actuator, red, without Tape, Tube)
pins: 1, 2, 3, 4, 5, 6, 7, 8, 9, 10, 11, 12

## WE-Dip Switches WS-DITU 418217170907
designator SW?
WS-DITU 2.54 mm right angled compact THT Dip Switch with flat actuator; Manufacturer: Würth Elektronik eiSos GmbH & Co.KG; ComponentLink1 Description: Manufacturer; ComponentLink2 Description: Datasheet; Creat by: Karrer Zheng; NoPins: 14; Creat Date: 13 February 2014; partNo: 418217170907; ComponentLink1URL: http://www.we-online.com; ComponentLink2URL: http://katalog.we-online.de/em/datasheet/4182171709xx.pdf
footprint 418217170907 (07p, 2.54mm Pitch, Right Angled, Box Type, THT, flat Actuator, red, without Tape, Tube)
pins: 1, 2, 3, 4, 5, 6, 7, 8, 9, 10, 11, 12, 13, 14

## WE-Dip Switches WS-DITU 418217170908
designator SW?
WS-DITU 2.54 mm right angled compact THT Dip Switch with flat actuator; Manufacturer: Würth Elektronik eiSos GmbH & Co.KG; ComponentLink1 Description: Manufacturer; ComponentLink2 Description: Datasheet; Creat by: Karrer Zheng; NoPins: 16; Creat Date: 13 February 2014; partNo: 418217170908; ComponentLink1URL: http://www.we-online.com; ComponentLink2URL: http://katalog.we-online.de/em/datasheet/4182171709xx.pdf
footprint 418217170908 (08p, 2.54mm Pitch, Right Angled, Box Type, THT, flat Actuator, red, without Tape, Tube)
pins: 1, 2, 3, 4, 5, 6, 7, 8, 9, 10, 11, 12, 13, 14, 15, 16
